# Altium integrated library ebike battery protection.IntLib: 44 symbols
Pins are listed as number, name and electrical type; pins without a type are passive.

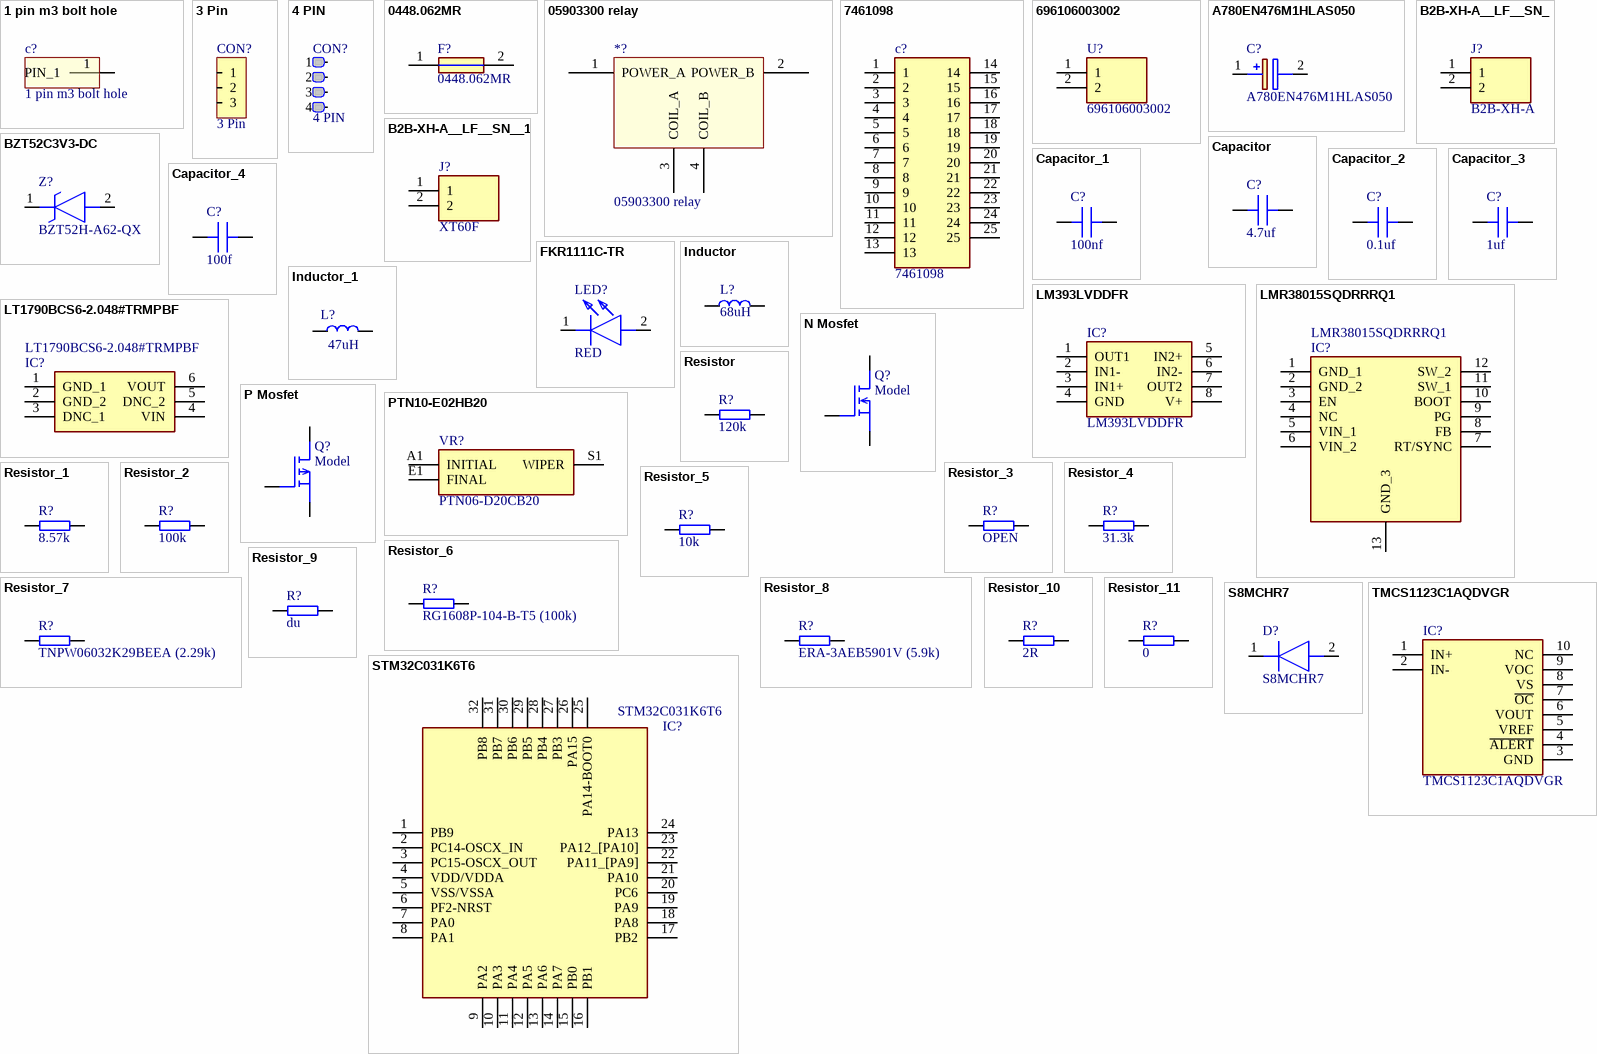
[diagram p0: symbols 1 pin m3 bolt hole to TMCS1123C1AQDVGR]

## 1 pin m3 bolt hole
designator c?
footprint m3 power hole
pins: 1 PIN_1

## 3 Pin
designator CON?
footprint BM03B-SRSS-TB
footprint SM03B-SRSS-TB
footprint Goldpin 2.54 3P
footprint JST HX 2.54 3P
pins: 1, 2, 3

## 4 PIN
designator CON?
footprint SM04B-SRSS-TB
footprint Goldpin 1.27mm 4PIN
footprint BM04B-SRSS-TB
footprint Goldpin 2.54mm  4Pin
pins: 1, 2, 3, 4

## 0448.062MR
designator F?
Fuse; Manufacturer_Name: LITTELFUSE; Datasheet Link: https://componentsearchengine.com/Datasheets/2/0448.062MR.pdf; Height: 2.69mm; Manufacturer_Part_Number: 0448.062MR; Mouser Part Number: 576-0448.062MR; Mouser Price/Stock: https://www.mouser.co.uk/ProductDetail/Littelfuse/0448.062MR?qs=7ubOrdQhHjPQsAdlJBZ1og%3D%3D
footprint FUSC6127X269N
pins: 1, 2

## 05903300 relay
designator *?
footprint hp_relay
pins: 1 POWER_A, 2 POWER_B, 3 COIL_A, 4 COIL_B

## 7461098
designator c?
Connector; Manufacturer_Name: Wurth Elektronik; Datasheet Link: https://katalog.we-online.com/em/datasheet/7461098.pdf; Height: 15.5mm; Manufacturer_Part_Number: 7461098; Mouser Part Number: 710-7461098; Mouser Price/Stock: https://www.mouser.co.uk/ProductDetail/Wurth-Elektronik/7461098?qs=lykWx4dhCCGHHs7z4oM%2FDg%3D%3D
footprint 7461098
pins: 1, 2, 3, 4, 5, 6, 7, 8, 9, 10, 11, 12, 13, 14, 15, 16, 17, 18, 19, 20, 21, 22, 23, 24, 25

## 696106003002
designator U?
Undefined or Miscellaneous; Manufacturer_Name: Wurth Elektronik; Datasheet Link: https://componentsearchengine.com/Datasheets/1/696106003002.pdf; Height: 11.6mm; Manufacturer_Part_Number: 696106003002; Mouser Part Number: 710-696106003002; Mouser Price/Stock: https://www.mouser.co.uk/ProductDetail/Wurth-Elektronik/696106003002?qs=%252BEew9%252B0nqrD8aph4yLDrDg%3D%3D
footprint 696106003002
pins: 1, 2

## A780EN476M1HLAS050
designator C?
Capacitor Polarised; Manufacturer_Name: KEMET; Datasheet Link: https://search.kemet.com/component-documentation/download/specsheet/A780EN476M1HLAS050; Height: 10mm; Manufacturer_Part_Number: A780EN476M1HLAS050
footprint CAPAE660X1000N
pins: 1 +, 2 -

## B2B-XH-A__LF__SN_
designator J?, comment B2B-XH-A
Connector; Manufacturer_Name: JST (JAPAN SOLDERLESS TERMINALS); Manufacturer_Part_Number: B2B-XH-A (LF)(SN); Datasheet Link: http://www.farnell.com/datasheets/5448.pdf; Height: 7mm
footprint SHDR2W64P0X250_1X2_740X575X700P
pins: 1, 2

## B2B-XH-A__LF__SN__1
designator J?, comment XT60F
Connector; Manufacturer_Name: JST (JAPAN SOLDERLESS TERMINALS); Manufacturer_Part_Number: B2B-XH-A (LF)(SN); Datasheet Link: http://www.farnell.com/datasheets/5448.pdf; Height: 7mm
footprint XT60F
footprint XT60F-S
pins: 1, 2

## BZT52C3V3-DC
designator Z?, comment BZT52H-A62-QX
Zener Diode; Manufacturer_Name: DC COMPONENTS CO.; Manufacturer_Part_Number: BZT52C3V3-DC; Datasheet Link: https://www.tme.eu/it/Document/615b5be1bd360366cd867e80cdd3ea35/BZT52C_SER.pdf; Height: 1.4mm
footprint SOD3816X140N
pins: 1 K, 2 A

## Capacitor
designator C?, comment 4.7uf
MLCC Capacitor
footprint C 0402 (0402 resistor Chip)
footprint C 0603
footprint C 0805
footprint C 1206
pins: 1, 2

## Capacitor_1
designator C?, comment 100nf
MLCC Capacitor
footprint C 0402 (0402 resistor Chip)
footprint C 0603
footprint C 0805
footprint C 1206
pins: 1, 2

## Capacitor_2
designator C?, comment 0.1uf
MLCC Capacitor
footprint C 0402 (0402 resistor Chip)
footprint C 0603
footprint C 0805
footprint C 1206
pins: 1, 2

## Capacitor_3
designator C?, comment 1uf
MLCC Capacitor
footprint C 0402 (0402 resistor Chip)
footprint C 0603
footprint C 0805
footprint C 1206
pins: 1, 2

## Capacitor_4
designator C?, comment 100f
MLCC Capacitor
footprint C 0402 (0402 resistor Chip)
footprint C 0603
footprint C 0805
footprint C 1206
pins: 1, 2

## FKR1111C-TR
designator LED?, comment RED
LED; Manufacturer_Name: Stanley Electric; Manufacturer_Part_Number: FKR1111C-TR; Datasheet Link: http://www.stanley-components.com/php/downloaddatafile.php?rp=0,FKR1111C-TR_e.pdf; Height: 0.8mm; Mouser Part Number: 327-FKR1111CTR; Mouser Price/Stock: https://www.mouser.co.uk/ProductDetail/Stanley-Electric/FKR1111C-TR?qs=byeeYqUIh0N4LNttpqKOoA%3D%3D; Arrow Part Number: FKR1111C-TR; Arrow Price/Stock: https://www.arrow.com/en/products/fkr1111c-tr/stanley-electric?region=nac
footprint LEDC1608X80N
pins: 1 K, 2 A

## Inductor
designator L?, comment 68uH
General pourpouse inductor
footprint L 0603
footprint L 0805
footprint L 1206
footprint DJNR60454R5FERROCORE
footprint HPI0630 (Power Inductor)
footprint LSRNJ12555GL680MMY
pins: 1, 2

## Inductor_1
designator L?, comment 47uH
General pourpouse inductor
footprint L 0603
footprint L 0805
footprint L 1206
footprint DJNR60454R5FERROCORE
footprint HPI0630 (Power Inductor)
footprint SRR1210390M
pins: 1, 2

## LM393LVDDFR
designator IC?
Integrated Circuit; Manufacturer_Name: Texas Instruments; Datasheet Link: https://www.ti.com/lit/ds/symlink/lm339lv.pdf; Height: 1.1mm; Manufacturer_Part_Number: LM393LVDDFR; Mouser Part Number: 595-LM393LVDDFR; Mouser Price/Stock: https://www.mouser.co.uk/ProductDetail/Texas-Instruments/LM393LVDDFR?qs=t7xnP681wgU3mxf6oy%252BzkQ%3D%3D; Arrow Part Number: LM393LVDDFR; Arrow Price/Stock: null?region=nac
footprint SOT65P280X110-8N
pins: 1 OUT1, 2 IN1-, 3 IN1+, 4 GND, 5 IN2+, 6 IN2-, 7 OUT2, 8 V+

## LMR38015SQDRRRQ1
designator IC?
Integrated Circuit; Manufacturer_Name: Texas Instruments; Datasheet Link: https://www.ti.com/lit/ds/symlink/lmr38015-q1.pdf?ts=1713432847481&ref_url=https%253A%252F%252Fwww.ti.com%252Fproduct%252FLMR38015-Q1%252Fpart-details%252FLMR38015SQDRRRQ1%253Futm_source%253Dgoogle%2526utm_medium%253Dcpc%2526utm_campaign%253Docb-tistore-n; Height: 0.8mm; Manufacturer_Part_Number: LMR38015SQDRRRQ1
footprint SON50P300X300X80-13N
pins: 1 GND_1, 2 GND_2, 3 EN, 4 NC, 5 VIN_1, 6 VIN_2, 7 RT/SYNC, 8 FB, 9 PG, 10 BOOT, 11 SW_1, 12 SW_2, 13 GND_3

## LT1790BCS6-2.048#TRMPBF
designator IC?
Integrated Circuit; Manufacturer_Name: Analog Devices; Datasheet Link: https://www.analog.com/media/en/technical-documentation/data-sheets/1790fc.pdf; Height: 1mm; Manufacturer_Part_Number: LT1790BCS6-2.048#TRMPBF; Mouser Part Number: 584-1790BC62.048TMPF; Mouser Price/Stock: https://www.mouser.co.uk/ProductDetail/Analog-Devices/LT1790BCS6-2.048TRMPBF?qs=ytflclh7QUVJGs6hkybxiQ%3D%3D; Arrow Part Number: LT1790BCS6-2.048#TRMPBF; Arrow Price/Stock: https://www.arrow.com/en/products/lt1790bcs6-2.048trmpbf/analog-devices
footprint SOT95P280X100-6N
pins: 1 GND_1, 2 GND_2, 3 DNC_1, 4 VIN, 5 DNC_2, 6 VOUT

## N Mosfet
designator Q?, comment Model
General Pourpouse Mosfet
footprint SOT23-3
footprint DFN 5x6 (PowerMOSFET)
footprint SOT323
pins: 1 G, 2 S, 3 D

## P Mosfet
designator Q?, comment Model
General Pourpouse Mosfet
footprint SOT23-3
footprint SOT323
pins: 1 G, 2 S, 3 D

## PTN10-E02HB20
designator VR?, comment PTN06-D20CB20
Variable Resistor; Manufacturer_Name: CUI Devices; Manufacturer_Part_Number: PTN10-E02HB20; Datasheet Link: https://www.mouser.pl/ProductDetail/CUI-Devices/PTN06-D20CB20?qs=Jm2GQyTW%2Fbi6yAl5ToF%252B9A%3D%3D; Height: 6.2mm; Mouser Part Number: 179-PTN10-E02HB20; Mouser Price/Stock: https://www.mouser.co.uk/ProductDetail/CUI-Devices/PTN10-E02HB20?qs=vvQtp7zwQdPZBhOJTXlYlA%3D%3D
footprint PTN10E02HB20
pins: A1 INITIAL, E1 FINAL, S1 WIPER

## Resistor
designator R?, comment 120k
General pourpouse resistor
footprint R 0402 (0402 resistor Chip)
footprint R 0603
footprint R 0805
footprint R 1206
footprint R 2512
pins: 1, 2

## Resistor_1
designator R?, comment 8.57k
General pourpouse resistor
footprint R 0402 (0402 resistor Chip)
footprint R 0603
footprint R 0805
footprint R 1206
footprint R 2512
pins: 1, 2

## Resistor_2
designator R?, comment 100k
General pourpouse resistor
footprint R 0402 (0402 resistor Chip)
footprint R 0603
footprint R 0805
footprint R 1206
footprint R 2512
pins: 1, 2

## Resistor_3
designator R?, comment OPEN
General pourpouse resistor
footprint R 0402 (0402 resistor Chip)
footprint R 0603
footprint R 0805
footprint R 1206
footprint R 2512
pins: 1, 2

## Resistor_4
designator R?, comment 31.3k
General pourpouse resistor
footprint R 0402 (0402 resistor Chip)
footprint R 0603
footprint R 0805
footprint R 1206
footprint R 2512
pins: 1, 2

## Resistor_5
designator R?, comment 10k
General pourpouse resistor
footprint R 0402 (0402 resistor Chip)
footprint R 0603
footprint R 0805
footprint R 1206
footprint R 2512
pins: 1, 2

## Resistor_6
designator R?, comment RG1608P-104-B-T5 (100k)
General pourpouse resistor
footprint R 0402 (0402 resistor Chip)
footprint R 0603
footprint R 0805
footprint R 1206
footprint R 2512
pins: 1, 2

## Resistor_7
designator R?, comment TNPW06032K29BEEA (2.29k)
General pourpouse resistor
footprint R 0402 (0402 resistor Chip)
footprint R 0603
footprint R 0805
footprint R 1206
footprint R 2512
pins: 1, 2

## Resistor_8
designator R?, comment ERA-3AEB5901V (5.9k)
General pourpouse resistor
footprint R 0402 (0402 resistor Chip)
footprint R 0603
footprint R 0805
footprint R 1206
footprint R 2512
pins: 1, 2

## Resistor_9
designator R?, comment du
General pourpouse resistor
footprint R 0402 (0402 resistor Chip)
footprint R 0603
footprint R 0805
footprint R 1206
footprint R 2512
pins: 1, 2

## Resistor_10
designator R?, comment 2R
General pourpouse resistor
footprint R 0402 (0402 resistor Chip)
footprint R 0603
footprint R 0805
footprint R 1206
footprint R 2512
pins: 1, 2

## Resistor_11
designator R?, comment 0
General pourpouse resistor
footprint R 0402 (0402 resistor Chip)
footprint R 0603
footprint R 0805
footprint R 1206
footprint R 2512
pins: 1, 2

## S8MCHR7
designator D?
Diode; Manufacturer_Name: Taiwan Semiconductor; Datasheet Link: https://www.taiwansemi.com/assets/uploads/datasheet/S8GCH%20SERIES_B2210.pdf; Height: 2.65mm; Manufacturer_Part_Number: S8MCHR7; Mouser Part Number: 821-S8MCHR7; Mouser Price/Stock: https://www.mouser.co.uk/ProductDetail/Taiwan-Semiconductor/S8MCHR7?qs=AQlKX63v8RvCIiq7OIToww%3D%3D
footprint DIOM8059X265N
pins: 1 K, 2 A

## STM32C031K6T6
designator IC?
Integrated Circuit; Manufacturer_Name: STMicroelectronics; Datasheet Link: https://www.st.com/resource/en/datasheet/stm32c031c4.pdf; Height: 1.6mm; Manufacturer_Part_Number: STM32C031K6T6; Mouser Part Number: 511-STM32C031K6T6; Mouser Price/Stock: https://www.mouser.co.uk/ProductDetail/STMicroelectronics/STM32C031K6T6?qs=IPgv5n7u5QYX61LfvY0BQA%3D%3D
footprint QFP80P900X900X160-32N
pins: 1 PB9, 2 PC14-OSCX_IN, 3 PC15-OSCX_OUT, 4 VDD/VDDA, 5 VSS/VSSA, 6 PF2-NRST, 7 PA0, 8 PA1, 9 PA2, 10 PA3, 11 PA4, 12 PA5, 13 PA6, 14 PA7, 15 PB0, 16 PB1, 17 PB2, 18 PA8, 19 PA9, 20 PC6, 21 PA10, 22 PA11_[PA9], 23 PA12_[PA10], 24 PA13, 25 PA14-BOOT0, 26 PA15, 27 PB3, 28 PB4, 29 PB5, 30 PB6, 31 PB7, 32 PB8

## TMCS1123C1AQDVGR
designator IC?
Integrated Circuit; Manufacturer_Name: Texas Instruments; Datasheet Link: https://www.ti.com/lit/ds/symlink/tmcs1123.pdf?ts=1704229136457&ref_url=https%253A%252F%252Fwww.ti.com%252Fproduct%252FTMCS1123; Height: 2.65mm; Manufacturer_Part_Number: TMCS1123C1AQDVGR; Mouser Part Number: 595-TMCS1123C1AQDVGR; Mouser Price/Stock: https://www.mouser.co.uk/ProductDetail/Texas-Instruments/TMCS1123C1AQDVGR?qs=mELouGlnn3cqlmNpXPPIig%3D%3D
footprint TMCS1123C1AQDVGR
pins: 1 IN+, 2 IN-, 3 GND, 4 ~{ALERT}, 5 VREF, 6 VOUT, 7 ~{OC}, 8 VS, 9 VOC, 10 NC

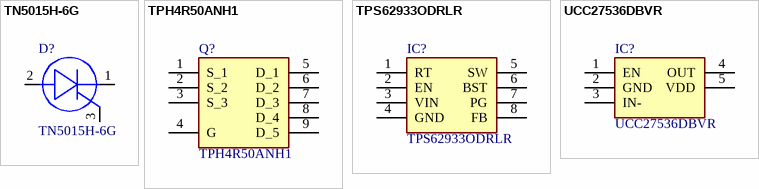
[diagram p1: symbols TN5015H-6G to UCC27536DBVR]

## TN5015H-6G
designator D?
SCR; Manufacturer_Name: STMicroelectronics; Datasheet Link: https://www.st.com/resource/en/datasheet/tn5015h-6g.pdf; Height: 4.83mm; Manufacturer_Part_Number: TN5015H-6G; Mouser Part Number: 511-TN5015H-6G; Mouser Price/Stock: https://www.mouser.com/Search/Refine.aspx?Keyword=511-TN5015H-6G
footprint TN5015H6G
pins: 1 K, 2 A, 3 G

## TPH4R50ANH1
designator Q?
MOSFET (N-Channel); Manufacturer_Name: Toshiba; Datasheet Link: https://toshiba.semicon-storage.com/info/docget.jsp?did=69024&prodName=TPH4R50ANH1; Height: 1.1mm; Manufacturer_Part_Number: TPH4R50ANH1
footprint TPH2R306NH1LQ
pins: 1 S_1, 2 S_2, 3 S_3, 4 G, 5 D_1, 6 D_2, 7 D_3, 8 D_4, 9 D_5

## TPS62933ODRLR
designator IC?
Integrated Circuit; Manufacturer_Name: Texas Instruments; Datasheet Link: https://www.ti.com/lit/ds/symlink/tps62933o.pdf?ts=1692352588671&ref_url=https%253A%252F%252Fwww.ti.com%252Fproduct%252FTPS62933O%252Fpart-details%252FTPS62933ODRLR; Height: 0.6mm; Manufacturer_Part_Number: TPS62933ODRLR; Mouser Part Number: 595-TPS62933ODRLR; Mouser Price/Stock: https://www.mouser.co.uk/ProductDetail/Texas-Instruments/TPS62933ODRLR?qs=By6Nw2ByBD3VuSv7z7GudQ%3D%3D; Arrow Part Number: TPS62933ODRLR; Arrow Price/Stock: https://www.arrow.com/en/products/tps62933odrlr/texas-instruments?region=europe
footprint SOTFL50P160X60-8N
pins: 1 RT, 2 EN, 3 VIN, 4 GND, 5 SW, 6 BST, 7 PG, 8 FB

## UCC27536DBVR
designator IC?
Integrated Circuit; Manufacturer_Name: Texas Instruments; Datasheet Link: http://www.ti.com/general/docs/suppproductinfo.tsp?distId=10&gotoUrl=http%3A%2F%2Fwww.ti.com%2Flit%2Fgpn%2Fucc27533; Height: 1.45mm; Manufacturer_Part_Number: UCC27536DBVR; Mouser Part Number: 595-UCC27536DBVR; Mouser Price/Stock: https://www.mouser.co.uk/ProductDetail/Texas-Instruments/UCC27536DBVR?qs=agb8jVP5T2duSTBNeBxClA%3D%3D; Arrow Part Number: UCC27536DBVR; Arrow Price/Stock: https://www.arrow.com/en/products/ucc27536dbvr/texas-instruments?region=nac
footprint SOT95P280X145-5N
pins: 1 EN, 2 GND, 3 IN-, 4 OUT, 5 VDD